# Altium footprint library Angler.PcbLib: 331 footprints (part 4 of 21)
Each footprint in its own frame and in the unit in brackets; x right, y up, seen from the top. Pads: shape width x height; smd on the part's side, far side on the other; paste and mask are expansions set on the pad; w line width, h text height; cw(c..) or ccw(c..) is an arc to the next point about the centre after c.
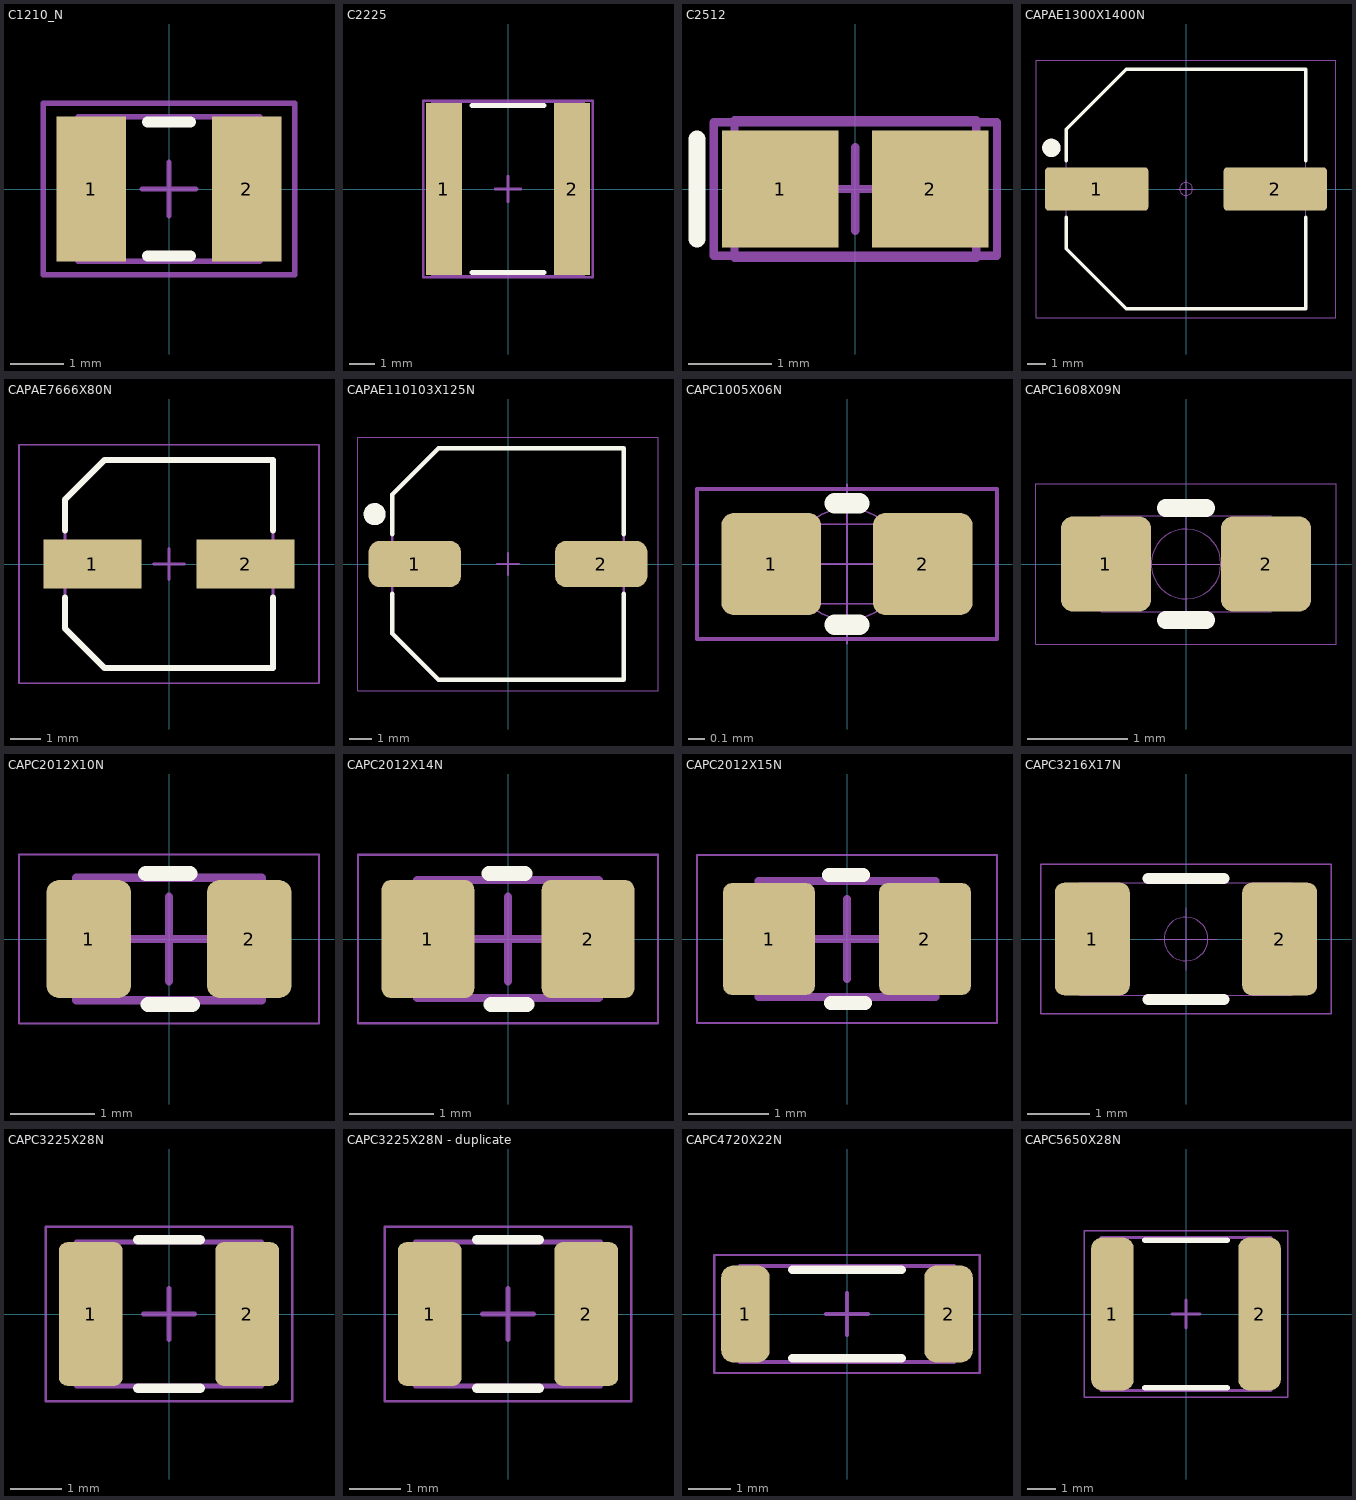
[diagram p3: the footprints below, top view; thin cyan lines are the x and y axes]

## C1210_N [mm] "Chip Capacitor, Body 3.2x2.5mm, IPC Medium Density"
height 1.5
pads (2):
  rect 1.3x2.7 smd: 1(-1.45,0) 2(1.45,0)
Top Overlay:
  lines w0.2: -0.4,-1.25 0.4,-1.25 ; -0.4,1.25 0.4,1.25
Mechanical 13:
  lines w0.1: -1.7,-1.35 1.7,-1.35 1.7,1.35 -1.7,1.35 -1.7,-1.35
Mechanical 15:
  lines w0.1: -0.5,0 0.5,0 ; 0,-0.5 0,0.5 ; -2.35,-1.6 2.35,-1.6 2.35,1.6 -2.35,1.6 -2.35,-1.6
3D body: height 1.5, standoff 0, extent -1.7,-1.35 1.7,1.35

## C2225 [mm] "Chip Capacitor, Body 5.7x6.4mm, IPC High Density"
height 1.4
pads (2):
  rect 1.4x6.7 smd: 1(-2.5,0) 2(2.5,0)
Top Overlay:
  lines w0.2: -1.4,-3.25 1.4,-3.25 ; -1.4,3.25 1.4,3.25
Mechanical 13:
  lines w0.1: -2.95,-3.4 2.95,-3.4 2.95,3.4 -2.95,3.4 -2.95,-3.4
Mechanical 15:
  lines w0.1: -0.5,0 0.5,0 ; 0,-0.5 0,0.5 ; -3.3,-3.45 3.3,-3.45 3.3,3.45 -3.3,3.45 -3.3,-3.45
3D body: height 1.4, standoff 0, extent -2.95,-3.4 2.95,3.4

## C2512 [mm] "Chip Capacitor, Body 2.54x1.27mm, IPC High Density"
height 1.3
pads (2):
  rect 1.4x1.4 smd: 1(-0.9,0) 2(0.9,0)
Top Overlay:
  lines w0.2: -1.9,-0.6 -1.9,0.6
Mechanical 13:
  lines w0.1: -1.45,-0.825 -1.45,0.825 1.45,0.825 1.45,-0.825 -1.45,-0.825
Mechanical 15:
  lines w0.1: -0.5,0 0.5,0 ; 0,-0.5 0,0.5 ; -1.7,-0.8 -1.7,0.8 1.7,0.8 1.7,-0.8 -1.7,-0.8
3D body: height 1.3, standoff 0, extent -1.45,-0.825 1.45,0.825

## CAPAE1300X1400N [mm] "Capacitor,Aluminum Electrolytic;13.00mm L X 13.00mm W X 14.00mm H"
height 14
pads (2):
  rrect15% 5.6x2.35 smd mask+0.064: 1(-4.85,0) 2(4.85,0)
Top Overlay:
  circle w0.5: c-7.315,2.235 r0.25
  lines w0.2: -6.5,-1.55 -6.5,-3.25 -3.25,-6.5 6.5,-6.5 6.5,-1.55 ; -6.5,1.55 -6.5,3.25 -3.25,6.5 6.5,6.5 6.5,1.55
Mechanical 9:
  lines w0.01: -6.5,-3.25 -6.5,3.25 -3.25,6.5 6.5,6.5 6.5,-6.5 -3.25,-6.5 -6.5,-3.25
Mechanical 11:
  text ".Designator" at -1.8,-0.8 h3
Mechanical 15:
  circle w0.01: c0,0 r0.35
  lines w0.01: -0.5,0 0.5,0 ; 0,-0.5 0,0.5 ; -8.15,-7 -8.15,7 8.15,7 8.15,-7 -8.15,-7
3D body "12.5X13.5_Chip.stp": height 13.3, standoff -0.2, extent -7.3,-6.8 7.3,6.8

## CAPAE7666X80N [mm] "Aluminum Electrolytic Capacitor, Body 6.60x6.60x8.00mm, IPC Medium Density"
height 8
pads (2):
  rect 3.2x1.6 smd: 1(-2.5,0) 2(2.5,0)
Top Overlay:
  lines w0.2: -3.4,-1.1 -3.4,-2.1 -2.1,-3.4 3.4,-3.4 3.4,-1.1 ; -3.4,1.1 -3.4,2.1 -2.1,3.4 3.4,3.4 3.4,1.1
Mechanical 9:
  lines w0.1: -3.4,-2.1 -3.4,2.1 -2.1,3.4 3.4,3.4 3.4,-3.4 -2.1,-3.4 -3.4,-2.1
Mechanical 11:
  text ".Designator" at -1.075,-0.45 h1
Mechanical 15:
  lines w0.05: -4.9,-3.9 4.9,-3.9 4.9,3.9 -4.9,3.9 -4.9,-3.9
  lines w0.1: -0.5,0 0.5,0 ; 0,-0.5 0,0.5
3D body "CAPAE7666X80N.step": height 8, standoff 0, extent -3.8,-3.4 3.8,3.4

## CAPAE110103X125N [mm] "Aluminum Electrolytic Capacitor, Body 10.30x10.30x12.50mm, IPC Medium Density"
height 12.5
pads (2):
  rrect50% 4.2x2.1 smd: 1(-4.225,0) 2(4.225,0)
Top Overlay:
  circle w0.5: c-6.045,2.261 r0.25
  lines w0.2: -5.25,-1.35 -5.25,-3.15 -3.15,-5.25 5.25,-5.25 5.25,-1.35 ; -5.25,1.35 -5.25,3.15 -3.15,5.25 5.25,5.25 5.25,1.35
Mechanical 9:
  lines w0.1: -5.25,-3.15 -5.25,3.15 -3.15,5.25 5.25,5.25 5.25,-5.25 -3.15,-5.25 -5.25,-3.15
Mechanical 11:
  text ".Designator" at -1.143,-0.584 h1
Mechanical 15:
  lines w0.05: -6.8,-5.75 6.8,-5.75 6.8,5.75 -6.8,5.75 -6.8,-5.75
  lines w0.1: -0.5,0 0.5,0 ; 0,-0.5 0,0.5
3D body "CAPAE110103X125N.step": height 12.5, standoff 0, extent -5.5,-5.25 5.5,5.25

## CAPC1005X06N [mm] "0402, Body 1.0x0.5x0.60mm, IPC Medium Density"
height 0.6
pads (2):
  rrect25% 0.625x0.64 smd paste+0 mask+0.051: 1(-0.475,0) 2(0.475,0)
Top Overlay:
  lines w0.127: -0.076,-0.381 0.076,-0.381 ; -0.076,0.381 0.076,0.381
Mechanical 9:
  lines w0.01: -0.28,-0.25 -0.28,0.25 ; 0.28,-0.25 0.28,0.25 ; -0.55,-0.25 -0.55,0.25 0.55,0.25 0.55,-0.25 -0.55,-0.25
Mechanical 11:
  text ".Designator" at -0.4,-0.1 h0.5
Mechanical 15:
  circle w0.01: c0,0 r0.35
  lines w0.01: -0.5,0 0.5,0 ; 0,-0.5 0,0.5
  lines w0.025: -0.94,-0.47 -0.94,0.47 0.94,0.47 0.94,-0.47 -0.94,-0.47
3D body "CAPC1005X06N.step": height 0.55, standoff 0, extent -0.525,-0.275 0.525,0.275

## CAPC1608X09N [mm] "0603, Body 1.6x0.8x0.94mm, IPC Medium Density"
height 0.94
pads (2):
  rrect25% 0.9x0.95 smd paste+0 mask+0.064: 1(-0.8,0) 2(0.8,0)
Top Overlay:
  lines w0.178: -0.203,-0.559 0.203,-0.559 ; -0.203,0.559 0.203,0.559
Mechanical 9:
  lines w0.01: -0.85,-0.48 -0.85,0.48 0.85,0.48 0.85,-0.48 -0.85,-0.48
Mechanical 11:
  text ".Designator" at -0.7,-0.2 h1
Mechanical 15:
  circle w0.01: c0,0 r0.35
  lines w0.01: -0.5,0 0.5,0 ; 0,-0.5 0,0.5 ; -1.5,-0.8 1.5,-0.8 1.5,0.8 -1.5,0.8 -1.5,-0.8
3D body "CAPC1608X09N.step": height 0.87, standoff 0, extent -0.875,-0.475 0.875,0.475

## CAPC2012X10N [mm] "0805, Body 2.00x1.25x1.0mm, IPC Medium Density"
height 1
pads (2):
  rrect30% 1x1.4 smd mask+0.064: 1(-0.95,0) 2(0.95,0)
Top Overlay:
  lines w0.178: -0.275,0.775 0.25,0.775 ; -0.25,-0.775 0.275,-0.775
Mechanical 9:
  lines w0.1: -1.1,-0.725 1.1,-0.725 1.1,0.725 -1.1,0.725 -1.1,-0.725
Mechanical 11:
  text "'.Designator'" at -0.5,-0.3 h0.5
Mechanical 15:
  lines w0.025: -1.775,-1 1.775,-1 1.775,1 -1.775,1 -1.775,-1
  lines w0.1: -0.5,0 0.5,0 ; 0,-0.5 0,0.5
3D body "CAPC2012X10N.step": height 0.95, standoff 0, extent -1.1,-0.725 1.1,0.725

## CAPC2012X14N [mm] "0805, Body 2.00x1.25x1.40mm, IPC Medium Density"
height 1.4
pads (2):
  rrect20% 1.1x1.4 smd mask+0.064: 1(-0.95,0) 2(0.95,0)
Top Overlay:
  lines w0.178: -0.225,0.775 0.2,0.775 ; -0.2,-0.775 0.225,-0.775
Mechanical 9:
  lines w0.1: -1.075,-0.7 1.075,-0.7 1.075,0.7 -1.075,0.7 -1.075,-0.7
Mechanical 11:
  text "'.Designator'" at -0.6,-0.3 h0.5
Mechanical 15:
  lines w0.025: -1.78,-1 -1.78,1 1.775,1 ; -1.775,-1 1.775,-1 ; 1.78,-1 1.78,1
  lines w0.1: -0.5,0 0.5,0 ; 0,-0.5 0,0.5
3D body "CAPC2012X14N.step": height 1.4, standoff 0, extent -1.075,-0.7 1.075,0.7

## CAPC2012X15N [mm] "0805, Body 2.01x1.25x1.5mm, IPC Medium Density"
height 1.52
pads (2):
  rrect20% 1.15x1.4 smd mask+0.064: 1(-0.975,0) 2(0.975,0)
Top Overlay:
  lines w0.178: -0.225,0.8 0.2,0.8 ; -0.2,-0.8 0.225,-0.8
Mechanical 9:
  lines w0.1: -1.105,-0.725 1.105,-0.725 1.105,0.725 -1.105,0.725 -1.105,-0.725
Mechanical 11:
  text "'.Designator'" at -0.6,-0.3 h0.5
Mechanical 15:
  lines w0.025: -1.875,-1.05 1.875,-1.05 1.875,1.05 -1.875,1.05 -1.875,-1.05
  lines w0.1: -0.5,0 0.5,0 ; 0,-0.5 0,0.5
3D body "CAPC2012X15N.step": height 1.52, standoff 0, extent -1.105,-0.725 1.105,0.725

## CAPC3216X17N [mm] "1206, Body 3.2x1.6x1.78mm, IPC Medium Density"
height 1.78
pads (2):
  rrect25% 1.2x1.8 smd paste+0 mask+0.064: 1(-1.499,0) 2(1.499,0)
Top Overlay:
  lines w0.178: -0.61,-0.965 0.61,-0.965 ; -0.61,0.965 0.61,0.965
Mechanical 9:
  lines w0.01: -1.2,-0.9 -1.2,0.9 ; 1.2,-0.9 1.2,0.9 ; -1.7,-0.9 1.7,-0.9 1.7,0.9 -1.7,0.9 -1.7,-0.9
Mechanical 11:
  text ".Designator" at -0.8,-0.2 h0.5
Mechanical 15:
  circle w0.01: c0,0 r0.35
  lines w0.01: -0.5,0 0.5,0 ; 0,-0.5 0,0.5
  lines w0.025: -2.325,-1.194 -2.325,1.194 2.325,1.194 2.325,-1.194 -2.325,-1.194
3D body "CAPC3216X17N.step": height 1.7, standoff 0, extent -1.7,-0.9 1.7,0.9

## CAPC3225X28N [mil] "1210, Body 3.20x2.50x2.8mm, IPC Medium Density"
height 110.24
pads (2):
  rrect25% 49x110.2 smd mask+2.5: 1(-60,0) 2(60,0)
Top Overlay:
  lines w7: -24,-57 24,-57 ; -24,57 24,57
Mechanical 11:
  lines w3.94: -70.87,-55.12 70.87,-55.12 70.87,55.12 -70.87,55.12 -70.87,-55.12
  text ".Designator" at -47.24,-15.75 h39.37
Mechanical 15:
  lines w1.97: -94.49,-67 94.49,-67 94.49,67 -94.49,67 -94.49,-67
  lines w3.94: -19.69,0 19.68,0 ; 0,-19.68 0,19.68
3D body "CAPC3225X28N.step": height 110.24, standoff 0, extent -70.87,-55.12 70.87,55.12

## CAPC3225X28N - duplicate [mil] "1210, Body 3.20x2.50x2.8mm, IPC Medium Density"
height 110.24
pads (2):
  rrect25% 49x110.2 smd mask+2.5: 1(-60,0) 2(60,0)
Top Overlay:
  lines w7: -24,-57 24,-57 ; -24,57 24,57
Mechanical 11:
  lines w3.94: -70.87,-55.12 -70.87,55.12 70.87,55.12 70.87,-55.12 -70.87,-55.12
  text ".Designator" at -47.24,-15.75 h39.37
Mechanical 15:
  lines w1.97: -94.49,-67 -94.49,67 94.49,67 94.49,-67 -94.49,-67
  lines w3.94: -19.69,0 19.68,0 ; 0,-19.68 0,19.68
3D body "CAPC3225X28N.step": height 110.24, standoff 0, extent -70.87,-55.12 70.87,55.12

## CAPC4720X22N [mm] "Chip Capacitor, 2-Leads, Body 4.73x2.03mm, IPC Medium Density Modified for 3.65mm Clearance between pads"
height 2.16
pads (2):
  rrect50% 1.15x2.3 smd: 1(-2.41,0) 2(2.41,0)
Top Overlay:
  lines w0.2: -1.3,-1.05 1.3,-1.05 ; -1.3,1.05 1.3,1.05
Mechanical 9:
  lines w0.1: -2.54,-1.14 2.54,-1.14 2.54,1.14 -2.54,1.14 -2.54,-1.14
Mechanical 15:
  lines w0.05: -3.15,-1.4 3.15,-1.4 3.15,1.4 -3.15,1.4 -3.15,-1.4
  lines w0.1: -0.5,0 0.5,0 ; 0,-0.5 0,0.5
3D body "CAPC4720X22N.step": height 2.16, standoff 0, extent -2.54,-1.14 2.54,1.14

## CAPC5650X28N [mm] "2220, Body 5.65x5.00x2.80mm, IPC Medium Density"
height 2.8
pads (2):
  rrect50% 1.5x5.4 smd: 1(-2.6,0) 2(2.6,0)
Top Overlay:
  lines w0.2: -1.45,-2.6 1.45,-2.6 ; -1.45,2.6 1.45,2.6
Mechanical 9:
  lines w0.1: -3,-2.7 -3,2.7 3,2.7 3,-2.7 -3,-2.7
Mechanical 11:
  text "'.Designator'" at -1.325,-0.675 h1
Mechanical 15:
  lines w0.05: -3.6,-2.95 -3.6,2.95 3.6,2.95 3.6,-2.95 -3.6,-2.95
  lines w0.1: -0.5,0 0.5,0 ; 0,-0.5 0,0.5
3D body "CAPC5650X28N.step": height 2.8, standoff 0, extent -3,-2.7 3,2.7